# Altium footprint library ZYF_Common.PcbLib: 66 footprints (part 5 of 5)
Each footprint in its own frame and in the unit in brackets; x right, y up, seen from the top. Pads: shape width x height; smd on the part's side, far side on the other; paste and mask are expansions set on the pad; w line width, h text height; cw(c..) or ccw(c..) is an arc to the next point about the centre after c.
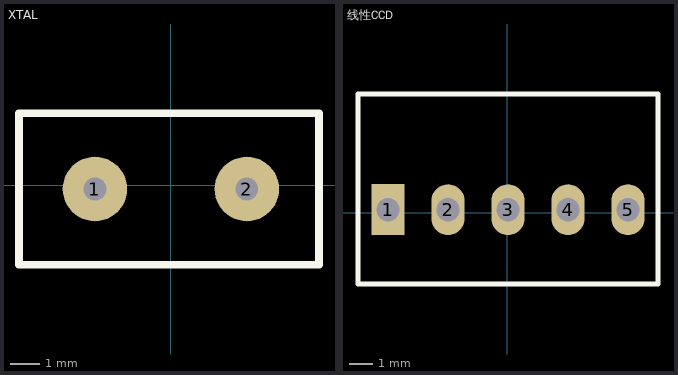
[diagram p4: the footprints below, top view; thin cyan lines are the x and y axes]

## XTAL [mil]
pads (2):
  round 85 hole 30: 1(-100,-5) 2(100,-5)
Top Overlay:
  lines w10: -200,-105 -200,95 195,95 195,-105 -200,-105
3D body: height 141.73, standoff -118.11, extent -218.14,-93 214.14,83.81

## 线性CCD [mil]
pads (5):
  rect 55x85 hole 39: 1(-199,5)
  oval 55x85 hole 39: 2(-99,5) 3(1,5) 4(101,5) 5(201,5)
Top Overlay:
  lines w7.87: -249,-119 -249,198 251,198 251,-119 -249,-119
3D body: height 322.83, standoff -118.11, extent -245.05,-44.04 254.94,54.32